# Altium footprint library SMT.PcbLib: 379 footprints (part 23 of 24)
Each footprint in its own frame and in the unit in brackets; x right, y up, seen from the top. Pads: shape width x height; smd on the part's side, far side on the other; paste and mask are expansions set on the pad; w line width, h text height; cw(c..) or ccw(c..) is an arc to the next point about the centre after c.
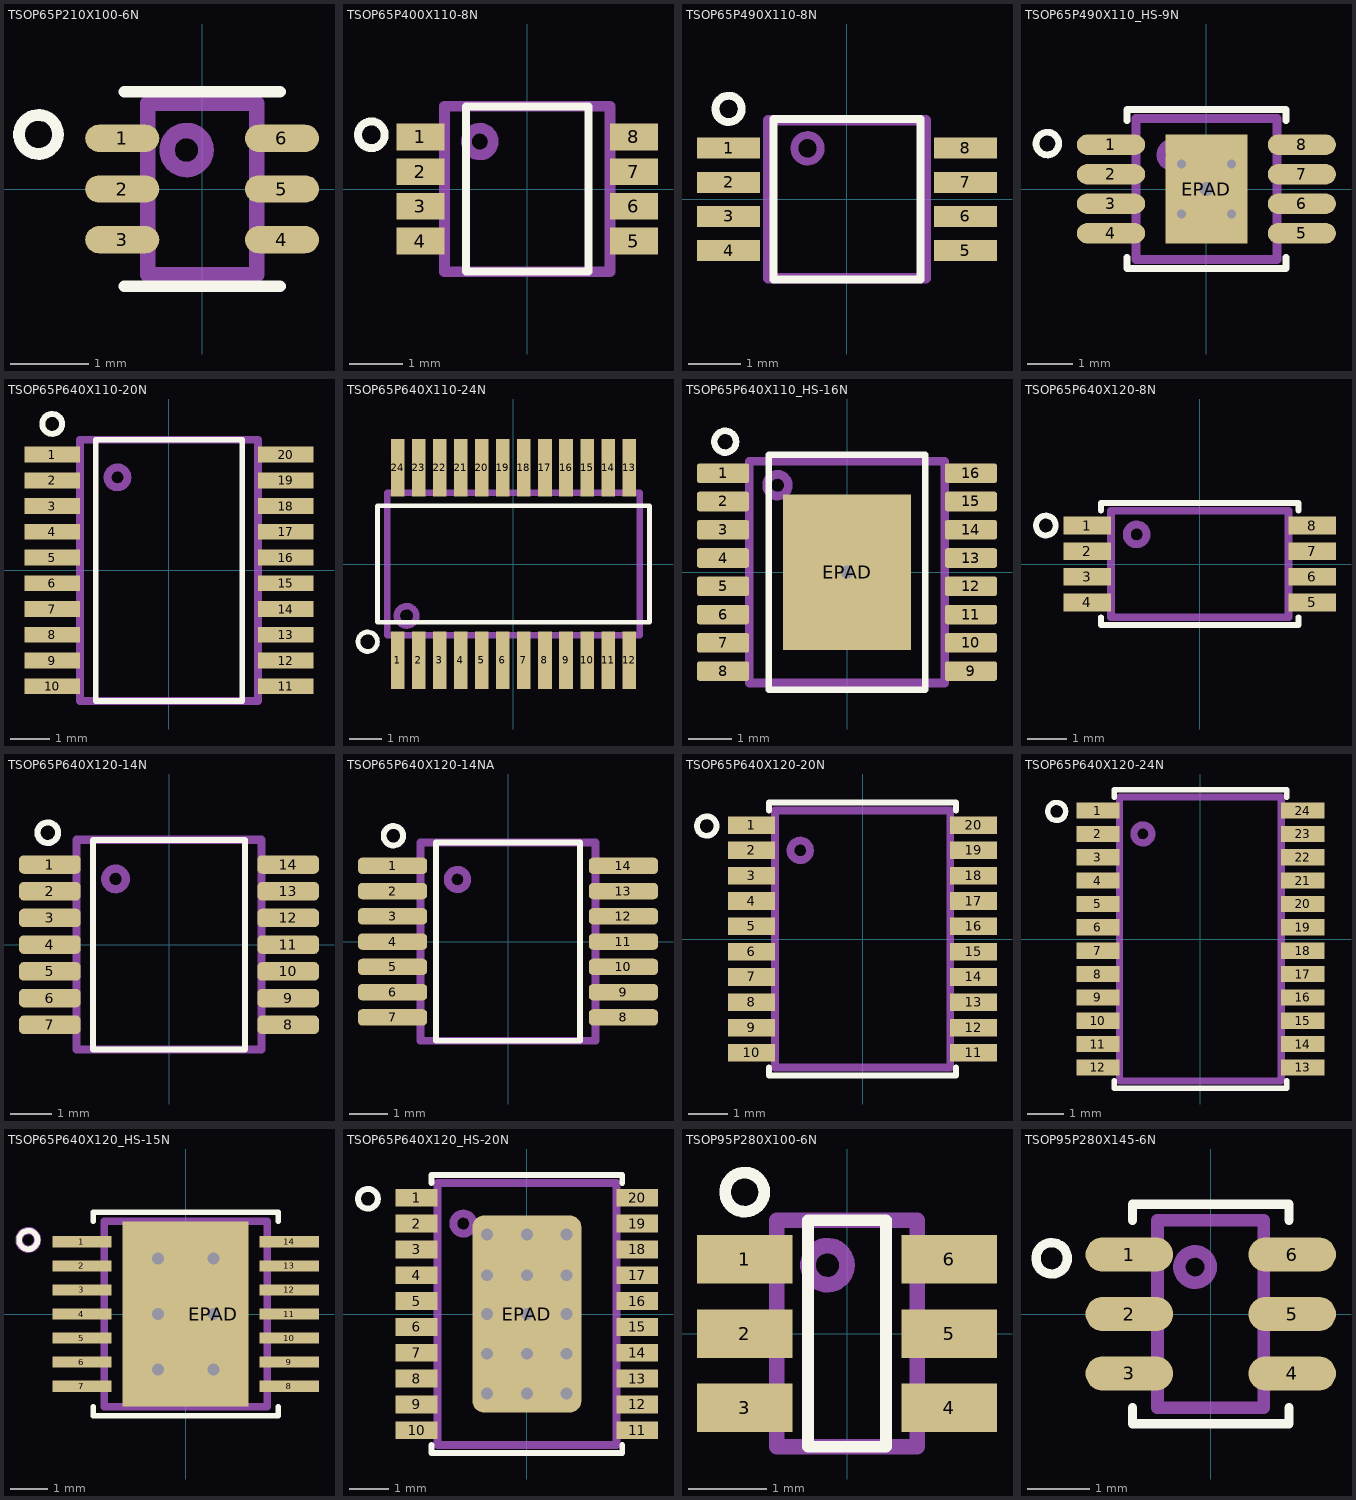
[diagram p22: the footprints below, top view; thin cyan lines are the x and y axes]

## TSOP65P210X100-6N [mm] "TSOP, 6-Leads, Body 2,00x1,25mm, Pitch 0,65mm, IPC Medium Density"
height 1
pads (6):
  oval 0.95x0.35 smd mask+0.08: 1(-1.025,0.65) 2(-1.025,0) 3(-1.025,-0.65) 4(1.025,-0.65) 5(1.025,0) 6(1.025,0.65)
Top Overlay:
  circle w0.15: c-2.1,0.7 r0.25
  lines w0.15: -1,-1.25 1,-1.25 ; -1,1.25 1,1.25
Mechanical 1:
  circle w0.2: c-0.2,0.5 r0.25
  lines w0.2: -0.7,-1.1 0.7,-1.1 0.7,1.1 -0.7,1.1 -0.7,-1.1
3D body "User Library-DCK(R-PDSO-G6).STEP": height 1.1, standoff 0, extent -1.1,-1 1.1,1

## TSOP65P400X110-8N [mm] "TSOP, 8-Leads, Body 3,00x3,00mm, Pitch 0,65mm, IPC Medium Density"
height 1.1
pads (8):
  rect 0.9x0.5 smd mask+0.025: 1(-2,0.975) 2(-2,0.325) 3(-2,-0.325) 4(-2,-0.975) 5(2,-0.975) 6(2,-0.325) 7(2,0.325) 8(2,0.975)
Top Overlay:
  circle w0.15: c-2.921,1.016 r0.25
  lines w0.15: -1.15,-1.55 -1.15,1.55 1.15,1.55 1.15,-1.55 -1.15,-1.55
Mechanical 1:
  circle w0.2: c-0.889,0.889 r0.25
  lines w0.2: -1.55,-1.55 -1.55,1.55 1.55,1.55 1.55,-1.55 -1.55,-1.55
3D body "User Library-IPC SOSOP65P400X135-8N MO-187DA DCT.STEP": height 1.5, standoff 0, extent -2.028,-1.575 2.028,1.575

## TSOP65P490X110-8N [mm] "Shrink Small Outline; 8 Leads; Body Width 3 mm; Pitch 0.65 mm"
height 1.1
pads (8):
  rect 1.2x0.4 smd mask+0.05: 1(-2.25,0.975) 2(-2.25,0.325) 3(-2.25,-0.325) 4(-2.25,-0.975) 5(2.25,-0.975) 6(2.25,-0.325) 7(2.25,0.325) 8(2.25,0.975)
Top Overlay:
  circle w0.15: c-2.25,1.72 r0.25
  lines w0.15: -1.4,-1.525 1.4,-1.525 1.4,1.525 -1.4,1.525 -1.4,-1.525
Mechanical 1:
  circle w0.15: c-0.75,0.97 r0.25
  lines w0.2: -1.5,-1.5 -1.5,1.5 1.5,1.5 1.5,-1.5 -1.5,-1.5
3D body "User Library-IPC SO-N.STEP": height 1.25, standoff 0, extent -2.478,-1.6 2.478,1.6

## TSOP65P490X110_HS-9N [mm] "TSOP, 8-Leads, Body 3,00x3,00mm, Pitch 0,65mm, Thermal Pad 2,4x1,8mm, IPC Medium Density"
height 1.1
pads (9):
  oval 1.5x0.45 smd mask+0.03: 1(-2.1,0.975) 2(-2.1,0.325) 3(-2.1,-0.325) 4(-2.1,-0.975) 5(2.1,-0.975) 6(2.1,-0.325) 7(2.1,0.325) 8(2.1,0.975)
  rect 1.8x2.4 hole 0.3 paste+25: EPAD(0,0)
via -0.55,0.55 diameter 0.5 hole 0.2
via 0.55,0.55 diameter 0.5 hole 0.2
via -0.55,-0.55 diameter 0.5 hole 0.2
via 0.55,-0.55 diameter 0.5 hole 0.2
Top Overlay:
  circle w0.15: c-3.5,1 r0.25
  lines w0.15: -1.75,-1.5 -1.75,-1.75 1.75,-1.75 1.75,-1.5 ; -1.75,1.5 -1.75,1.75 1.75,1.75 1.75,1.5
Top Paste:
  region: -0.65,-0.75 0.65,-0.75 0.65,0.75 -0.65,0.75
Mechanical 1:
  circle w0.2: c-0.75,0.75 r0.25
  lines w0.2: -1.55,-1.55 -1.55,1.55 1.55,1.55 1.55,-1.55 -1.55,-1.55
3D body "TSOP65P490-8.STEP": height 1.11, standoff 0.01, extent -2.45,-1.55 2.45,1.55

## TSOP65P640X110-20N [mm] "TSOP, 20-Leads, Body 6,50x4,40mm, Pitch 0,65mm, IPC Medium Density"
height 1.1
pads (20):
  rect 1.4x0.4 smd paste+0 mask+0.05: 1(-2.95,2.925) 2(-2.95,2.275) 3(-2.95,1.625) 4(-2.95,0.975) 5(-2.95,0.325) 6(-2.95,-0.325) 7(-2.95,-0.975) 8(-2.95,-1.625) 9(-2.95,-2.275) 10(-2.95,-2.925) 11(2.95,-2.925) 12(2.95,-2.275) 13(2.95,-1.625) 14(2.95,-0.975) 15(2.95,-0.325) 16(2.95,0.325) 17(2.95,0.975) 18(2.95,1.625) 19(2.95,2.275) 20(2.95,2.925)
Top Overlay:
  circle w0.15: c-2.95,3.7 r0.25
  lines w0.15: -1.85,-3.3 1.85,-3.3 1.85,3.3 -1.85,3.3 -1.85,-3.3
Mechanical 1:
  circle w0.2: c-1.3,2.35 r0.25
  lines w0.2: -2.25,-3.3 2.25,-3.3 2.25,3.3 -2.25,3.3 -2.25,-3.3
3D body "TSOP65P640X110-20N.step": height 1.1, standoff 0, extent -3.2,-3.25 3.2,3.25

## TSOP65P640X110-24N [mm] "Body:7.8х4.4х1.1mm; 24-Lead; Pitch 0.65mm"
height 1.1
pads (24):
  rect 0.42x1.78 smd mask+0.05: 1(-3.575,-2.97) 2(-2.925,-2.97) 3(-2.275,-2.97) 4(-1.625,-2.97) 5(-0.975,-2.97) 6(-0.325,-2.97) 7(0.325,-2.97) 8(0.975,-2.97) 9(1.625,-2.97) 10(2.275,-2.97) 11(2.925,-2.97) 12(3.575,-2.97) 13(3.575,2.97) 14(2.925,2.97) 15(2.275,2.97) 16(1.625,2.97) 17(0.975,2.97) 18(0.325,2.97) 19(-0.325,2.97) 20(-0.975,2.97) 21(-1.625,2.97) 22(-2.275,2.97) 23(-2.925,2.97) 24(-3.575,2.97)
Top Overlay:
  circle w0.15: c-4.5,-2.4 r0.3
  lines w0.15: -4.2,-1.8 -4.2,1.8 4.2,1.8 4.2,-1.8 -4.2,-1.8
Mechanical 1:
  circle w0.2: c-3.3,-1.6 r0.3
  lines w0.2: -3.575,-3.2 -3.575,-2.2 ; -3.575,2.2 -3.575,3.2 ; -2.925,-3.2 -2.925,-2.2 ; -2.925,2.2 -2.925,3.2 ; -2.275,-3.2 -2.275,-2.2 ; -2.275,2.2 -2.275,3.2 ; -1.625,-3.2 -1.625,-2.2 ; -1.625,2.2 -1.625,3.2 ; -0.975,-3.2 -0.975,-2.2 ; -0.975,2.2 -0.975,3.2 ; -0.325,-3.2 -0.325,-2.2 ; -0.325,2.2 -0.325,3.2 ; 0.325,-3.2 0.325,-2.2 ; 0.325,2.2 0.325,3.2 ; 0.975,-3.2 0.975,-2.2 ; 0.975,2.2 0.975,3.2 ; 1.625,-3.2 1.625,-2.2 ; 1.625,2.2 1.625,3.2 ; 2.275,-3.2 2.275,-2.2 ; 2.275,2.2 2.275,3.2 ; 2.925,-3.2 2.925,-2.2 ; 2.925,2.2 2.925,3.2 ; 3.575,-3.2 3.575,-2.2 ; 3.575,2.2 3.575,3.2 ; -3.9,-2.2 -3.9,2.2 3.9,2.2 3.9,-2.2 -3.9,-2.2
3D body "Микросхема 74 LVX4245.stp": height 1.2, standoff 0, extent -3.95,-3.278 3.95,3.278

## TSOP65P640X110_HS-16N [mm] "SMD; TSOP, 20-Leads, Body 5,1x4,5x1,1 mm (max), Pitch 0,65mm, IPC Medium Density"
height 1.1
pads (17):
  rrect25% 1.2x0.45 smd mask+0.03: 1(-2.85,2.275) 2(-2.85,1.625) 3(-2.85,0.975) 4(-2.85,0.325) 5(-2.85,-0.325) 6(-2.85,-0.975) 7(-2.85,-1.625) 8(-2.85,-2.275) 9(2.85,-2.275) 10(2.85,-1.625) 11(2.85,-0.975) 12(2.85,-0.325) 13(2.85,0.325) 14(2.85,0.975) 15(2.85,1.625) 16(2.85,2.275)
  rect 2.94x3.58 hole 0.3: EPAD(0,0)
Top Overlay:
  circle w0.15: c-2.8,3 r0.25
  lines w0.15: -1.8,-2.7 -1.8,2.7 1.8,2.7 1.8,-2.7 -1.8,-2.7
Top Paste:
  rectangle: -1.3,-1.75 1.3,1.75
Mechanical 1:
  circle w0.2: c-1.6,2 r0.25
  lines w0.2: -3.2,-2.275 -2.25,-2.275 ; -3.2,-1.625 -2.25,-1.625 ; -3.2,-0.975 -2.25,-0.975 ; -3.2,-0.325 -2.25,-0.325 ; -3.2,0.325 -2.25,0.325 ; -3.2,0.975 -2.25,0.975 ; -3.2,1.625 -2.25,1.625 ; 2.25,-2.275 3.2,-2.275 ; 2.25,-1.625 3.2,-1.625 ; 2.25,-0.975 3.2,-0.975 ; 2.25,-0.325 3.2,-0.325 ; 2.25,0.325 3.2,0.325 ; 2.25,0.975 3.2,0.975 ; 2.25,1.625 3.2,1.625 ; -3.2,2.275 -2.25,2.275 -3.2,2.275 ; -2.25,-2.55 2.25,-2.55 2.25,2.55 -2.25,2.55 -2.25,-2.55 ; 2.25,2.275 3.2,2.275 2.25,2.275
3D body "Микросхема TSOP65P640X110_HS-16N.STEP": height 1.1, standoff 0, extent -3.2,-2.5 3.2,2.5

## TSOP65P640X120-8N [mm] "TSOP, 8-Leads, Body 6,6x4,5mm (max), Pitch 0,65mm, IPC Medium Density"
height 1.2
pads (8):
  rect 1.2x0.45 smd mask+0.03: 1(-2.85,0.975) 2(-2.85,0.325) 3(-2.85,-0.325) 4(-2.85,-0.975) 5(2.85,-0.975) 6(2.85,-0.325) 7(2.85,0.325) 8(2.85,0.975)
Top Overlay:
  circle w0.15: c-3.9,0.975 r0.25
  lines w0.15: -2.5,-1.35 -2.5,-1.55 2.5,-1.55 2.5,-1.35 ; -2.5,1.35 -2.5,1.55 2.5,1.55 2.5,1.35
Mechanical 1:
  circle w0.2: c-1.6,0.75 r0.25
  lines w0.2: -2.25,-1.35 -2.25,1.35 2.25,1.35 2.25,-1.35 -2.25,-1.35
3D body "TSSOP8.stp": height 1.01, standoff 0.01, extent -3.14,-1.5 3.14,1.5

## TSOP65P640X120-14N [mm] "TSOP, 14-Leads, Body 5,00x4,40mm, Pitch 0,65mm, IPC Medium Density"
height 1.2
pads (14):
  rrect50% 1.5x0.45 smd paste-0.025 mask+0.04: 1(-2.9,1.95) 2(-2.9,1.3) 3(-2.9,0.65) 4(-2.9,0) 5(-2.9,-0.65) 6(-2.9,-1.3) 7(-2.9,-1.95) 8(2.9,-1.95) 9(2.9,-1.3) 10(2.9,-0.65) 11(2.9,0) 12(2.9,0.65) 13(2.9,1.3) 14(2.9,1.95)
Top Overlay:
  circle w0.15: c-2.95,2.725 r0.25
  lines w0.15: -1.85,-2.55 -1.85,2.55 1.85,2.55 1.85,-2.55 -1.85,-2.55
Mechanical 1:
  circle w0.2: c-1.3,1.6 r0.25
  lines w0.2: -2.25,-2.55 -2.25,2.55 2.25,2.55 2.25,-2.55 -2.25,-2.55
3D body "TSOP65P640X120-14N.step": height 1.2, standoff 0, extent -3.2,-2.55 3.2,2.55

## TSOP65P640X120-14NA [mm] "TSOP, 14-Leads, Body 5,00x4,40mm, Pitch 0,65mm, IPC Medium Density"
height 1.2
pads (14):
  rrect50% 1.78x0.42 smd paste-0.025 mask+0.04: 1(-2.97,1.95) 2(-2.97,1.3) 3(-2.97,0.65) 4(-2.97,0) 5(-2.97,-0.65) 6(-2.97,-1.3) 7(-2.97,-1.95) 8(2.97,-1.95) 9(2.97,-1.3) 10(2.97,-0.65) 11(2.97,0) 12(2.97,0.65) 13(2.97,1.3) 14(2.97,1.95)
Top Overlay:
  circle w0.15: c-2.95,2.725 r0.25
  lines w0.15: -1.85,-2.55 -1.85,2.55 1.85,2.55 1.85,-2.55 -1.85,-2.55
Mechanical 1:
  circle w0.2: c-1.3,1.6 r0.25
  lines w0.2: -2.25,-2.55 -2.25,2.55 2.25,2.55 2.25,-2.55 -2.25,-2.55
3D body "TSOP65P640X120-14N.step": height 1.2, standoff 0, extent -3.2,-2.55 3.2,2.55

## TSOP65P640X120-20N [mm] "TSOP, 20-Leads, Body 6,6x4,5mm (max), Pitch 0,65mm, IPC Medium Density"
height 1.2
pads (20):
  rect 1.2x0.45 smd mask+0.03: 1(-2.85,2.925) 2(-2.85,2.275) 3(-2.85,1.625) 4(-2.85,0.975) 5(-2.85,0.325) 6(-2.85,-0.325) 7(-2.85,-0.975) 8(-2.85,-1.625) 9(-2.85,-2.275) 10(-2.85,-2.925) 11(2.85,-2.925) 12(2.85,-2.275) 13(2.85,-1.625) 14(2.85,-0.975) 15(2.85,-0.325) 16(2.85,0.325) 17(2.85,0.975) 18(2.85,1.625) 19(2.85,2.275) 20(2.85,2.925)
Top Overlay:
  circle w0.15: c-4,2.9 r0.25
  lines w0.15: -2.4,-3.3 -2.4,-3.5 2.4,-3.5 2.4,-3.3 ; -2.4,3.3 -2.4,3.5 2.4,3.5 2.4,3.3
Mechanical 1:
  circle w0.2: c-1.6,2.275 r0.25
  lines w0.2: -2.25,-3.3 2.25,-3.3 2.25,3.3 -2.25,3.3 -2.25,-3.3
3D body "SW3dPS-TSOP_20.STEP": height 1.85, standoff 0.01, extent -3.3,-3.3 3.3,3.3

## TSOP65P640X120-24N [mm] "TSOP, 24-Leads, Body 6,6x4,5mm (max), Pitch 0,65mm, IPC Medium Density"
height 1.2
pads (24):
  rect 1.2x0.45 smd mask+0.03: 1(-2.85,3.575) 2(-2.85,2.925) 3(-2.85,2.275) 4(-2.85,1.625) 5(-2.85,0.975) 6(-2.85,0.325) 7(-2.85,-0.325) 8(-2.85,-0.975) 9(-2.85,-1.625) 10(-2.85,-2.275) 11(-2.85,-2.925) 12(-2.85,-3.575) 13(2.85,-3.575) 14(2.85,-2.925) 15(2.85,-2.275) 16(2.85,-1.625) 17(2.85,-0.975) 18(2.85,-0.325) 19(2.85,0.325) 20(2.85,0.975) 21(2.85,1.625) 22(2.85,2.275) 23(2.85,2.925) 24(2.85,3.575)
Top Overlay:
  circle w0.15: c-4,3.55 r0.25
  lines w0.15: -2.4,-3.95 -2.4,-4.15 2.4,-4.15 2.4,-3.95 ; -2.4,3.95 -2.4,4.15 2.4,4.15 2.4,3.95
Mechanical 1:
  circle w0.2: c-1.6,2.925 r0.25
  lines w0.2: -2.25,-3.95 -2.25,3.95 2.25,3.95 2.25,-3.95 -2.25,-3.95
3D body "TSSOP24.stp": height 0.99, standoff 0.01, extent -3.2,-3.9 3.2,3.9

## TSOP65P640X120_HS-15N [mm] "TSOP, 14-Leads, Body 5,00x4,40mm, Pitch 0,65mm, IPC Medium Density"
height 1.2
pads (15):
  rect 1.6x0.3 smd paste-0.025 mask+0.07: 1(-2.8,1.95) 2(-2.8,1.3) 3(-2.8,0.65) 4(-2.8,0) 5(-2.8,-0.65) 6(-2.8,-1.3) 7(-2.8,-1.95) 8(2.8,-1.95) 9(2.8,-1.3) 10(2.8,-0.65) 11(2.8,0) 12(2.8,0.65) 13(2.8,1.3) 14(2.8,1.95)
  rect 3.4x5 hole 0.33 copper offset -0.75,0 paste-20 mask-20: EPAD(0.75,0)
via -0.75,1.5 diameter 0.63 hole 0.33
via 0.75,1.5 diameter 0.63 hole 0.33
via 0.75,-1.5 diameter 0.63 hole 0.33
via -0.75,-1.5 diameter 0.63 hole 0.33
via -0.75,0 diameter 0.63 hole 0.33
Top Overlay:
  circle w0.15: c-4.25,2 r0.25
  lines w0.15: -2.5,-2.5 -2.5,-2.75 2.5,-2.75 2.5,-2.5 ; -2.5,2.5 -2.5,2.75 2.5,2.75 2.5,2.5
Top Paste:
  region: -1.23,-1.155 -1.23,1.155 1.23,1.155 1.23,-1.155
Top Solder:
  region: -1.23,-1.155 -1.23,1.155 1.23,1.155 1.23,-1.155
Mechanical 1:
  circle w0.2: c-4.25,2 r0.25
  lines w0.2: -2.2,-2.5 -2.2,2.5 2.2,2.5 2.2,-2.5 -2.2,-2.5
3D body "1TSOP65P640X120_HS-15N.step": height 1.2, standoff 0, extent -3.2,-2.55 3.2,2.55

## TSOP65P640X120_HS-20N [mm] "TSOP, 20-Leads, Body 6,6x4,5mm (max), Pitch 0,65mm, IPC Medium Density"
height 1.2
pads (21):
  rect 1.05x0.45 smd mask+0.03: 1(-2.775,2.925) 2(-2.775,2.275) 3(-2.775,1.625) 4(-2.775,0.975) 5(-2.775,0.325) 6(-2.775,-0.325) 7(-2.775,-0.975) 8(-2.775,-1.625) 9(-2.775,-2.275) 10(-2.775,-2.925) 11(2.775,-2.925) 12(2.775,-2.275) 13(2.775,-1.625) 14(2.775,-0.975) 15(2.775,-0.325) 16(2.775,0.325) 17(2.775,0.975) 18(2.775,1.625) 19(2.775,2.275) 20(2.775,2.925)
  rrect20% 2.74x4.95 hole 0.3: EPAD(0,0)
via -1,2 diameter 0.7 hole 0.3
via -1,0.975 diameter 0.7 hole 0.3
via -1,0 diameter 0.7 hole 0.3
via -1,-1 diameter 0.7 hole 0.3
via -1,-2 diameter 0.7 hole 0.3
via 1,-2 diameter 0.7 hole 0.3
via 1,-1 diameter 0.7 hole 0.3
via 1,0 diameter 0.7 hole 0.3
via 1,0.975 diameter 0.7 hole 0.3
via 1,2 diameter 0.7 hole 0.3
via 0,-2 diameter 0.7 hole 0.3
via 0,-1 diameter 0.7 hole 0.3
via 0,2 diameter 0.7 hole 0.3
via 0,0.975 diameter 0.7 hole 0.3
Top Overlay:
  circle w0.15: c-4,2.9 r0.25
  lines w0.15: -2.4,-3.3 -2.4,-3.5 2.4,-3.5 2.4,-3.3 ; -2.4,3.3 -2.4,3.5 2.4,3.5 2.4,3.3
Mechanical 1:
  circle w0.2: c-1.6,2.275 r0.25
  lines w0.2: -2.25,-3.3 -2.25,3.3 2.25,3.3 2.25,-3.3 -2.25,-3.3
3D body "SW3dPS-TSOP_20.STEP": height 1.85, standoff 0.01, extent -3.3,-3.3 3.3,3.3

## TSOP95P280X100-6N [mm] "TSOP, 6-Leads, Body 2,90x1,63mm, Pitch 0,95mm, IPC Medium Density"
height 1
pads (6):
  rect 1.22x0.62 smd: 1(-1.31,0.95) 2(-1.31,0) 3(-1.31,-0.95) 4(1.31,-0.95) 5(1.31,0) 6(1.31,0.95)
Top Overlay:
  circle w0.15: c-1.31,1.81 r0.25
  lines w0.15: -0.5,-1.45 -0.5,1.45 0.5,1.45 0.5,-1.45 -0.5,-1.45
Mechanical 1:
  circle w0.2: c-0.25,0.875 r0.25
  lines w0.2: -0.9,-1.45 -0.9,1.45 0.9,1.45 0.9,-1.45 -0.9,-1.45
3D body "TSOP95P280X100-6N.step": height 1, standoff 0, extent -1.4,-1.45 1.4,1.45

## TSOP95P280X145-6N [mm] "TSOP, 6-Leads, Body 2,90x1,60mm, Pitch 0,95mm, IPC Medium Density"
height 1.45
pads (6):
  oval 1.4x0.55 smd: 1(-1.3,0.95) 2(-1.3,0) 3(-1.3,-0.95) 4(1.3,-0.95) 5(1.3,0) 6(1.3,0.95)
Top Overlay:
  circle w0.15: c-2.54,0.889 r0.25
  lines w0.15: -1.25,-1.5 -1.25,-1.75 1.25,-1.75 1.25,-1.5 ; -1.25,1.5 -1.25,1.75 1.25,1.75 1.25,1.5
Mechanical 1:
  circle w0.2: c-0.25,0.75 r0.25
  lines w0.2: -0.85,-1.5 -0.85,1.5 0.85,1.5 0.85,-1.5 -0.85,-1.5
3D body "User Library-ZXTC2045E6TA.STEP": height 1.4, standoff 0, extent -1.5,-1.55 1.5,1.55